# Altium footprint library Semicon-Discrete.pcblib: 205 footprints (part 8 of 13)
Each footprint in its own frame and in the unit in brackets; x right, y up, seen from the top. Pads: shape width x height; smd on the part's side, far side on the other; paste and mask are expansions set on the pad; w line width, h text height; cw(c..) or ccw(c..) is an arc to the next point about the centre after c.
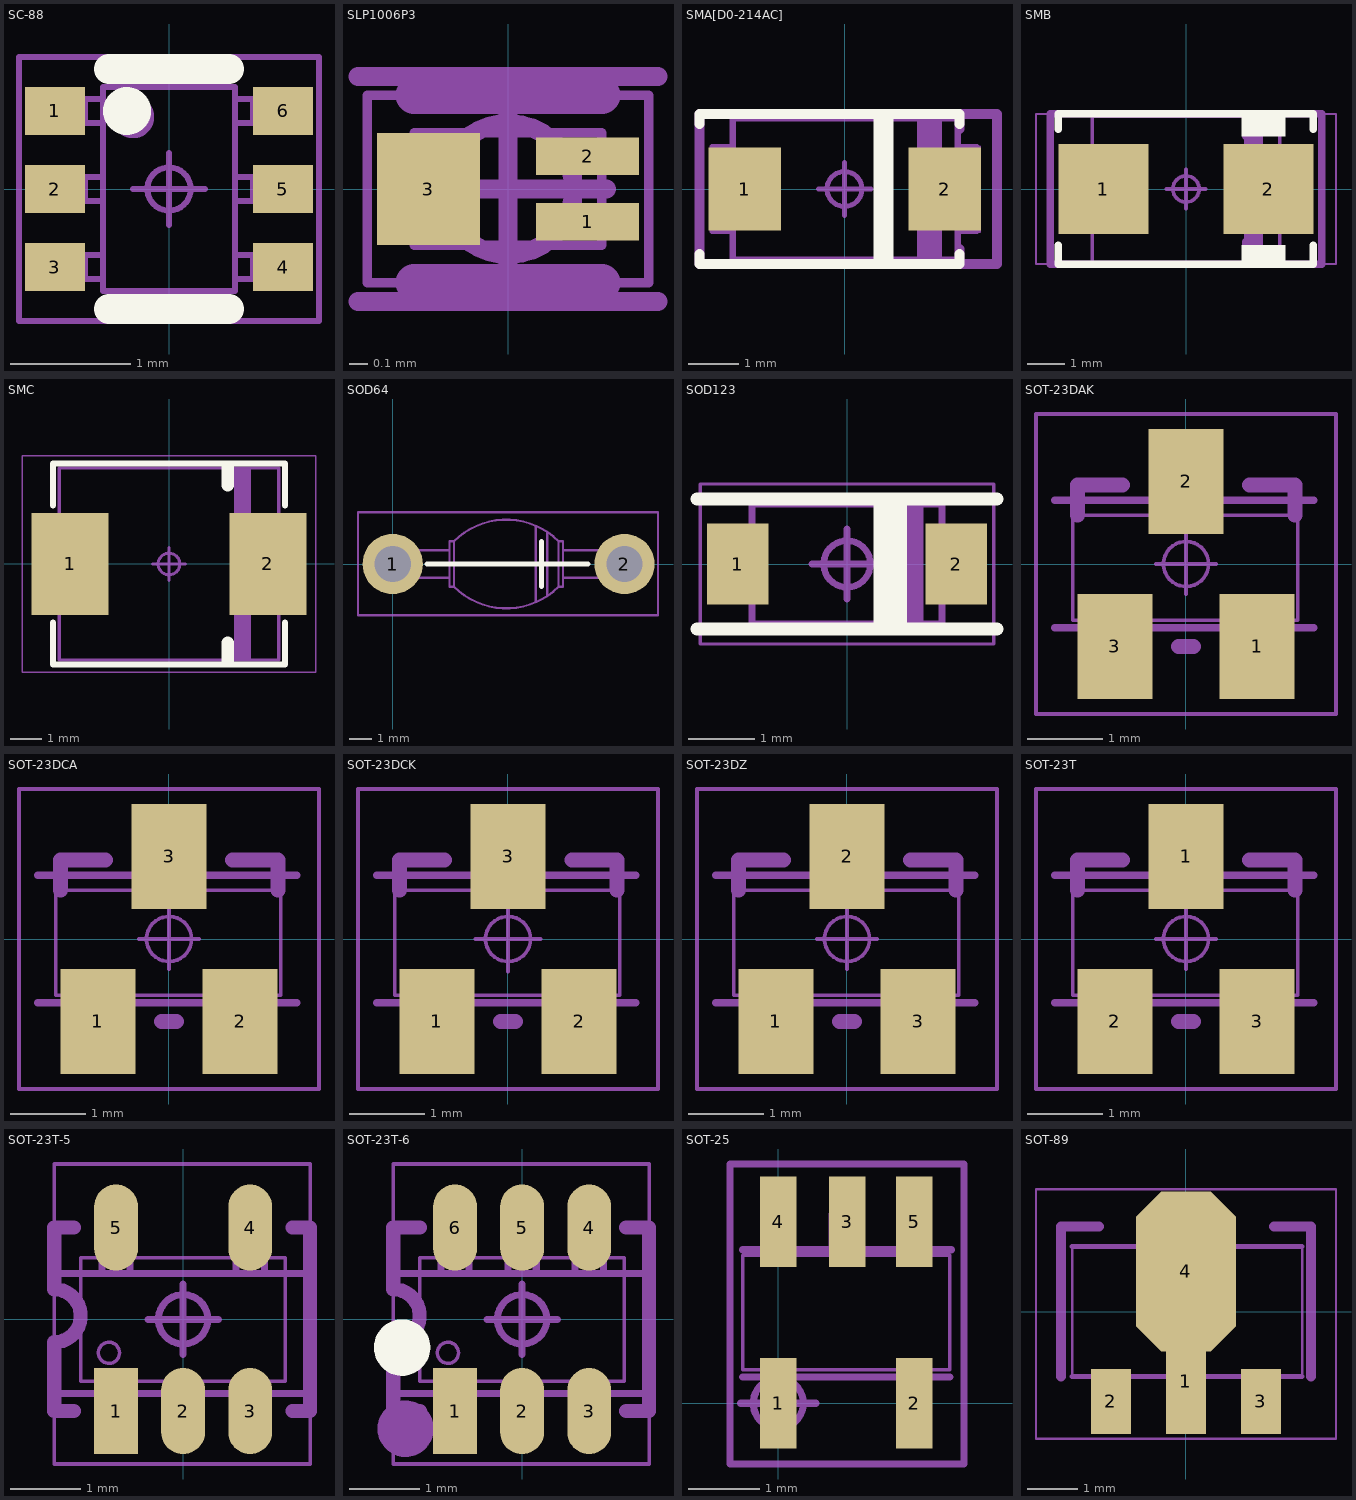
[diagram p7: the footprints below, top view; thin cyan lines are the x and y axes]

## SC-88 [mm]
height 1
pads (6):
  rect 0.5x0.4 smd: 1(-0.95,0.65) 2(-0.95,0) 3(-0.95,-0.65) 4(0.95,-0.65) 5(0.95,0) 6(0.95,0.65)
TopOverlay:
  circle w0.2: c-0.35,0.65 r0.1
  lines w0.254: -0.5,-1 0.5,-1 ; -0.5,1 0.5,1
2-TopCompOutl:
  circle w0.254: c-0.3,0.6 r0.05
  lines w0.05: -0.8,-0.75 -0.8,-0.55 ; -0.8,-0.1 -0.8,0.1 ; -0.8,0.55 -0.8,0.75 ; -0.7,-0.75 -0.7,-0.55 ; -0.7,-0.1 -0.7,0.1 ; -0.7,0.55 -0.7,0.75 ; -0.55,-0.75 -1.1,-0.75 -1.1,-0.55 -0.55,-0.55 ; -0.55,-0.1 -1.1,-0.1 -1.1,0.1 -0.55,0.1 ; -0.55,0.55 -1.1,0.55 -1.1,0.75 -0.55,0.75 ; 0.55,-0.75 1.1,-0.75 1.1,-0.55 0.55,-0.55 ; 0.55,-0.1 1.1,-0.1 1.1,0.1 0.55,0.1 ; 0.55,0.55 1.1,0.55 1.1,0.75 0.55,0.75 ; 0.7,-0.75 0.7,-0.55 ; 0.7,-0.1 0.7,0.1 ; 0.7,0.55 0.7,0.75 ; 0.8,-0.75 0.8,-0.55 ; 0.8,-0.1 0.8,0.1 ; 0.8,0.55 0.8,0.75 ; -0.55,-0.85 0,-0.85 0.55,-0.85 0.55,0 0.55,0.85 0,0.85 -0.55,0.85 -0.55,0 -0.55,-0.85
4-TopCourty:
  circle w0.05: c0,0 r0.18
  lines w0.05: -0.3,0 0.3,0 ; 0,-0.3 0,0.3 ; -1.25,-1.1 1.25,-1.1 1.25,1.1 0,1.1 -1.25,1.1 -1.25,-1.1
7-TopAssy:
  circle w0.254: c-0.3,0.6 r0.05
  lines w0.05: -0.8,-0.75 -0.8,-0.55 ; -0.8,-0.1 -0.8,0.1 ; -0.8,0.55 -0.8,0.75 ; -0.7,-0.75 -0.7,-0.55 ; -0.7,-0.1 -0.7,0.1 ; -0.7,0.55 -0.7,0.75 ; -0.55,-0.75 -1.1,-0.75 -1.1,-0.55 -0.55,-0.55 ; -0.55,-0.1 -1.1,-0.1 -1.1,0.1 -0.55,0.1 ; -0.55,0.55 -1.1,0.55 -1.1,0.75 -0.55,0.75 ; 0.55,-0.75 1.1,-0.75 1.1,-0.55 0.55,-0.55 ; 0.55,-0.1 1.1,-0.1 1.1,0.1 0.55,0.1 ; 0.55,0.55 1.1,0.55 1.1,0.75 0.55,0.75 ; 0.7,-0.75 0.7,-0.55 ; 0.7,-0.1 0.7,0.1 ; 0.7,0.55 0.7,0.75 ; 0.8,-0.75 0.8,-0.55 ; 0.8,-0.1 0.8,0.1 ; 0.8,0.55 0.8,0.75 ; -0.55,-0.85 0,-0.85 0.55,-0.85 0.55,0 0.55,0.85 0,0.85 -0.55,0.85 -0.55,0 -0.55,-0.85
  text ".Designator" at 0.55,-1.275 h1.8
3D body "SC-88.STEP": height 0.99, standoff -0.01, extent -1.15,-1 1.15,1

## SLP1006P3 [mm] "3DModel=0805.ogl"
pads (3):
  rect 0.55x0.2 smd: 1(0.425,-0.175) 2(0.425,0.175)
  rect 0.55x0.6 smd: 3(-0.425,0)
2-TopCompOutl:
  lines w0.05: -0.5,-0.3 -0.5,0 -0.5,0.3 0.5,0.3 0.5,-0.3 -0.5,-0.3
4-TopCourty:
  circle w0.1: c0,0 r0.35
  lines w0.05: -0.75,-0.5 -0.75,0.5 0.75,0.5 0.75,-0.5 -0.75,-0.5
  lines w0.1: -0.525,0 0.525,0 ; 0,-0.525 0,0.525
7-TopAssy:
  lines w0.1: -0.8,-0.6 0.8,-0.6 ; -0.8,0.6 0.8,0.6
  text ".Designator" at -1.275,-0.525 h1.6
13-SMDTopOverlay:
  lines w0.2: -0.5,-0.5 0.5,-0.5 ; -0.5,0.5 0.5,0.5
3D body "SLP1006P3.STEP": height 0.5, standoff 0, extent -0.575,-0.3 0.525,0.3

## SMA[D0-214AC] [mm] "Surface Mount Plastic Rectifier"
height 2.3
pads (2):
  rect 1.45x1.67 smd: 1(-2,0) 2(2,0)
TopOverlay:
  lines w0.2: -2.9,-1.3 -2.9,-1.5 2.3,-1.5 2.3,-1.3 ; -2.9,1.3 -2.9,1.5 2.3,1.5 2.3,1.3
  lines w0.4: 0.775,-1.4 0.775,1.375
2-TopCompOutl:
  lines w0.05: -2.2,-0.85 -2.6,-0.85 -2.6,0.85 -2.2,0.85 ; 1.5,-1.4 1.5,1.4 ; 1.7,-1.4 1.7,1.4 ; 2.3,-0.85 2.7,-0.85 2.7,0.85 2.3,0.85 ; -2.2,-1.4 -2.2,1.4 2.3,1.4 2.3,-1.4 -2.2,-1.4
4-TopCourty:
  circle w0.1: c0,0 r0.35
  lines w0.05: -2.95,-1.5 3,-1.5 3,1.5 -2.95,1.5 -2.95,-1.5
  lines w0.1: -0.525,0 0.525,0 ; 0,-0.525 0,0.525
7-TopAssy:
  rectangle: 1.45,-1.4 1.95,1.4
  lines w0.1: -2.25,-0.85 -2.65,-0.85 -2.65,0.85 -2.25,0.85 ; 2.25,-0.85 2.65,-0.85 2.65,0.85 2.25,0.85 ; -2.25,-1.4 -2.25,1.4 2.25,1.4 2.25,-1.4 -2.25,-1.4
  text ".Designator" at -1.925,-0.65 h2.2
13-SMDTopOverlay:
  lines w0.2: 2.3,-1.5 2.3,-1.2 ; 2.3,1.2 2.3,1.5 ; -2.9,-1.5 1.25,-1.5 3.05,-1.5 3.05,1.5 -2.9,1.5 -2.9,-1.5
3D body "SMA[D0-214AC].STEP": height 2.36, standoff 0, extent -2.6,-1.45 2.6,1.45

## SMB [mm]
pads (2):
  rect 2.4x2.4 smd: 1(-2.2,0) 2(2.2,0)
TopOverlay:
  rectangle: 1.475,1.4 2.65,1.975
  rectangle: 1.475,-1.975 2.65,-1.5
  lines w0.2: -3.4,-1.5 -3.4,-2 3.4,-2 3.4,-1.5 ; -3.4,1.6 -3.4,2 3.4,2 3.4,1.6
2-TopCompOutl:
  lines w0.05: -2.5,-1.1 -2.85,-1.1 -2.85,1.1 -2.5,1.1 ; 2.5,-1.1 2.85,-1.1 2.85,1.1 2.5,1.1 ; -2.5,-1.95 2.5,-1.95 2.5,1.95 -2.5,1.95 -2.5,-1.95
4-TopCourty:
  circle w0.1: c0,0 r0.35
  lines w0.05: -4,-2 -4,2 4,2 4,-2 -4,-2
  lines w0.1: -0.525,0 0.525,0 ; 0,-0.525 0,0.525
7-TopAssy:
  rectangle: 1.55,-1.95 2.05,1.95
  lines w0.1: -2.5,-1.1 -2.85,-1.1 -2.85,1.1 -2.5,1.1 ; 2.5,-1.1 2.85,-1.1 2.85,1.1 2.5,1.1 ; -2.5,-1.95 2.5,-1.95 2.5,1.95 -2.5,1.95 -2.5,-1.95
  text ".Designator" at -2.55,-0.625 h2.2
13-SMDTopOverlay:
  lines w0.2: 1.6,-2 1.6,-1.4 ; 1.6,1.4 1.6,2 ; -3.625,-2 -3.625,2 1.05,2 3.625,2 3.625,-2 1.05,-2 -3.625,-2
3D body "SMB.STEP": height 2.36, standoff 0, extent -2.825,-1.975 2.875,1.975

## SMC [mm]
pads (2):
  rect 2.5x3.3 smd: 1(-3.2,0) 2(3.2,0)
TopOverlay:
  lines w0.2: -3.75,-1.9 -3.75,-3.25 3.75,-3.25 3.75,-1.9 ; -3.75,1.9 -3.75,3.25 3.75,3.25 3.75,1.9
  lines w0.4: 1.9,-3.15 1.9,-2.55 ; 1.9,2.55 1.9,3.15
2-TopCompOutl:
  rectangle: 2.1,-3.1 2.65,3.1
  lines w0.05: -3.55,-1.55 -4.05,-1.55 -4.05,1.55 -3.55,1.55 ; 3.55,-1.55 4.05,-1.55 4.05,1.55 3.55,1.55 ; -3.55,-3.1 3.55,-3.1 3.55,3.1 -3.55,3.1 -3.55,-3.1
4-TopCourty:
  circle w0.1: c0,0 r0.35
  lines w0.05: -4.75,-3.5 4.75,-3.5 4.75,3.5 -4.75,3.5 -4.75,-3.5
  lines w0.1: -0.525,0 0.525,0 ; 0,-0.525 0,0.525
7-TopAssy:
  rectangle: 2.1,-3.1 2.65,3.1
  lines w0.1: -3.55,-1.55 -4.05,-1.55 -4.05,1.55 -3.55,1.55 ; 3.55,-1.55 4.05,-1.55 4.05,1.55 3.55,1.55 ; -3.55,-3.1 3.55,-3.1 3.55,3.1 -3.55,3.1 -3.55,-3.1
  text ".Designator" at -1.3,-0.625 h2
3D body "SMC.STEP": height 2.6, standoff 0, extent -4.025,-3.1 4.075,3.1

## SOD64 [mm]
pads (2):
  round 2.65 hole 1.6: 1(0,0) 2(10.2,0)
TopOverlay:
  lines w0.2: 1.5,0 4,0 8.6,0 ; 6.55,-1 6.55,1
2-TopCompOutl:
  lines w0.1: 2.5,-0.6 0,-0.6 0,0.6 2.5,0.6 ; 6.299,-1.676 6.299,1.676 ; 6.8,-1.4 6.8,1.4 ; 7.5,-0.6 10,-0.6 10,0.6 7.5,0.6 ; 2.7,-1 ccw(c5,1.3) 7.3,-1 ; 2.7,-1 2.7,0 2.7,1 ; 2.7,-1 2.5,-1 2.5,0 2.5,1 2.7,1 ; 2.7,1 cw(c5,-1.3) 7.3,1 ; 7.3,-1 7.3,0 7.3,1 ; 7.3,-1 7.5,-1 7.5,0 7.5,1 7.3,1
4-TopCourty:
  circle w0.1: c0,0 r0.35
  lines w0.1: -0.525,0 0.525,0 ; 0,-0.525 0,0.525 ; -1.525,-2.25 -1.525,2.275 11.675,2.275 11.675,-2.25 -1.525,-2.25
7-TopAssy:
  lines w0.1: 2.5,-0.6 0,-0.6 cw(c0,0) 0,0.6 2.5,0.6 ; 6.299,-1.676 6.299,1.676 ; 6.8,-1.4 6.8,1.4 ; 7.5,-0.6 10,-0.6 ccw(c10,0) 10,0.6 7.5,0.6 ; 2.7,-1 ccw(c5,1.3) 7.3,-1 ; 2.7,-1 2.5,-1 2.5,0 2.5,1 2.7,1 ; 2.7,-1 2.7,0 2.7,1 ; 2.7,1 cw(c5,-1.3) 7.3,1 ; 7.3,-1 7.5,-1 7.5,0 7.5,1 7.3,1 ; 7.3,-1 7.3,0 7.3,1
  text ".Designator" at 3.15,-0.775 h2.2

## SOD123 [mm] "Surface Mount Plastic Rectifier"
height 1.2
pads (2):
  rect 0.92x1.22 smd: 1(-1.64,0) 2(1.64,0)
TopOverlay:
  rectangle: 0.4,-0.95 0.9,1
  lines w0.2: -2.25,-0.975 2.25,-0.975 ; -2.25,0.975 2.25,0.975
2-TopCompOutl:
  lines w0.05: -1.45,-0.35 -1.85,-0.35 -1.85,0.35 -1.45,0.35 ; 0.9,-0.9 0.9,0.9 ; 1.1,-0.9 1.1,0.9 ; 1.45,-0.35 1.85,-0.35 1.85,0.35 1.45,0.35 ; -1.425,-0.9 -1.425,0.9 1.425,0.9 1.425,-0.9 -1.425,-0.9
4-TopCourty:
  circle w0.1: c0,0 r0.35
  lines w0.05: -2.2,-1.2 -2.2,1.2 2.2,1.2 2.2,-1.2 -2.2,-1.2
  lines w0.1: -0.525,0 0.525,0 ; 0,-0.525 0,0.525
7-TopAssy:
  rectangle: 0.825,-0.9 1.15,0.9
  lines w0.1: -1.45,-0.35 -1.85,-0.35 -1.85,0.35 -1.45,0.35 ; 1.45,-0.35 1.85,-0.35 1.85,0.35 1.45,0.35 ; -1.425,-0.9 -1.425,0.9 1.425,0.9 1.425,-0.9 -1.425,-0.9
  text ".Designator" at -1.65,-0.6 h1.8
3D body "SOD123.STEP": height 1.27, standoff 0, extent -1.875,-0.825 1.825,0.775

## SOT-23DAK [mm] "SOT-23.ogl"
pads (3):
  rect 1x1.4 smd: 1(0.95,-1.1) 2(0,1.1) 3(-0.95,-1.1)
2-TopCompOutl:
  lines w0.05: -1.15,-0.75 -1.15,-1.35 -0.75,-1.35 -0.75,-0.75 ; -0.2,0.65 -0.2,1.25 0.2,1.25 0.2,0.65 ; 0.75,-0.75 0.75,-1.35 1.15,-1.35 1.15,-0.75 ; -1.509,-0.75 -1.509,0.65 1.491,0.65 1.491,-0.75 -1.509,-0.75
4-TopCourty:
  circle w0.05: c0,0 r0.3
  lines w0.05: -0.4,0 0.4,0 ; 0,-0.4 0,0.4 ; -2,-2 -2,2 2,2 2,-2 -2,-2
7-TopAssy:
  lines w0.1: -1.75,-0.85 1.7,-0.85 ; -1.75,0.85 1.7,0.85 ; -1.15,-0.85 -1.15,-1.45 -0.75,-1.45 -0.75,-0.85 ; -0.2,0.85 -0.2,1.45 0.2,1.45 0.2,0.85 ; 0.75,-0.85 0.75,-1.45 1.15,-1.45 1.15,-0.85
  text ".Designator" at -1.85,-0.55 h1.8
13-SMDTopOverlay:
  lines w0.2: -1.45,0.65 -1.45,1.05 -0.85,1.05 ; -0.1,-1.1 0.1,-1.1 ; 0.85,1.05 1.45,1.05 1.45,0.65
3D body "SOT-23DAK.STEP": height 1.4, standoff 0, extent -1.4,-1.5 1.409,1.59

## SOT-23DCA [mm] "SOT-23.ogl"
pads (3):
  rect 1x1.4 smd: 1(-0.95,-1.1) 2(0.95,-1.1) 3(0,1.1)
2-TopCompOutl:
  lines w0.05: -1.15,-0.75 -1.15,-1.35 -0.75,-1.35 -0.75,-0.75 ; -0.2,0.65 -0.2,1.25 0.2,1.25 0.2,0.65 ; 0.75,-0.75 0.75,-1.35 1.15,-1.35 1.15,-0.75 ; -1.509,-0.75 -1.509,0.65 1.491,0.65 1.491,-0.75 -1.509,-0.75
4-TopCourty:
  circle w0.05: c0,0 r0.3
  lines w0.05: -0.4,0 0.4,0 ; 0,-0.4 0,0.4 ; -2,-2 -2,2 2,2 2,-2 -2,-2
7-TopAssy:
  lines w0.1: -1.75,-0.85 1.7,-0.85 ; -1.75,0.85 1.7,0.85 ; -1.15,-0.85 -1.15,-1.45 -0.75,-1.45 -0.75,-0.85 ; -0.2,0.85 -0.2,1.45 0.2,1.45 0.2,0.85 ; 0.75,-0.85 0.75,-1.45 1.15,-1.45 1.15,-0.85
  text ".Designator" at -1.8,-0.55 h1.8
13-SMDTopOverlay:
  lines w0.2: -1.45,0.65 -1.45,1.05 -0.85,1.05 ; -0.1,-1.1 0.1,-1.1 ; 0.85,1.05 1.45,1.05 1.45,0.65
3D body "SOT-23DCA.STEP": height 1.4, standoff 0, extent -1.425,-1.55 1.384,1.54

## SOT-23DCK [mm] "SOT-23.ogl"
pads (3):
  rect 1x1.4 smd: 1(-0.95,-1.1) 2(0.95,-1.1) 3(0,1.1)
2-TopCompOutl:
  lines w0.05: -1.15,-0.75 -1.15,-1.35 -0.75,-1.35 -0.75,-0.75 ; -0.2,0.65 -0.2,1.25 0.2,1.25 0.2,0.65 ; 0.75,-0.75 0.75,-1.35 1.15,-1.35 1.15,-0.75 ; -1.509,-0.75 1.491,-0.75 1.491,0.65 -1.509,0.65 -1.509,-0.75
4-TopCourty:
  circle w0.05: c0,0 r0.3
  lines w0.05: -0.432,0 0.432,0 ; 0,-0.432 0,0.432 ; -2,-2 2,-2 2,2 -2,2 -2,-2
7-TopAssy:
  lines w0.1: -1.75,-0.85 1.7,-0.85 ; -1.75,0.85 1.7,0.85 ; -1.15,-0.85 -1.15,-1.45 -0.75,-1.45 -0.75,-0.85 ; -0.2,0.85 -0.2,1.45 0.2,1.45 0.2,0.85 ; 0.75,-0.85 0.75,-1.45 1.15,-1.45 1.15,-0.85
  text ".Designator" at -1.75,-0.55 h1.8
13-SMDTopOverlay:
  lines w0.2: -1.45,0.65 -1.45,1.05 -0.85,1.05 ; -0.1,-1.1 0.1,-1.1 ; 0.85,1.05 1.45,1.05 1.45,0.65
3D body "SOT-23DCK.STEP": height 1.4, standoff 0, extent -1.4,-1.525 1.409,1.565

## SOT-23DZ [mm] "SOT-23.ogl"
pads (3):
  rect 1x1.4 smd: 1(-0.95,-1.1) 2(0,1.1) 3(0.95,-1.1)
2-TopCompOutl:
  lines w0.05: -1.15,-0.75 -1.15,-1.35 -0.75,-1.35 -0.75,-0.75 ; -0.2,0.65 -0.2,1.25 0.2,1.25 0.2,0.65 ; 0.75,-0.75 0.75,-1.35 1.15,-1.35 1.15,-0.75 ; -1.509,-0.75 -1.509,0.65 1.491,0.65 1.491,-0.75 -1.509,-0.75
4-TopCourty:
  circle w0.05: c0,0 r0.3
  lines w0.05: -0.4,0 0.4,0 ; 0,-0.4 0,0.4 ; -2,-2 -2,2 2,2 2,-2 -2,-2
7-TopAssy:
  lines w0.1: -1.75,-0.85 1.7,-0.85 ; -1.75,0.85 1.7,0.85 ; -1.15,-0.85 -1.15,-1.45 -0.75,-1.45 -0.75,-0.85 ; -0.2,0.85 -0.2,1.45 0.2,1.45 0.2,0.85 ; 0.75,-0.85 0.75,-1.45 1.15,-1.45 1.15,-0.85
  text ".Designator" at -1.75,-0.55 h1.8
13-SMDTopOverlay:
  lines w0.2: -1.45,0.65 -1.45,1.05 -0.85,1.05 ; -0.1,-1.1 0.1,-1.1 ; 0.85,1.05 1.45,1.05 1.45,0.65
3D body "SOT-23DZ.STEP": height 1.4, standoff 0, extent -1.4,-1.575 1.409,1.515

## SOT-23T [mm] "SOT-23.ogl"
pads (3):
  rect 1x1.4 smd: 1(0,1.1) 2(-0.95,-1.1) 3(0.95,-1.1)
2-TopCompOutl:
  lines w0.05: -1.15,-0.75 -1.15,-1.35 -0.75,-1.35 -0.75,-0.75 ; -0.2,0.65 -0.2,1.25 0.2,1.25 0.2,0.65 ; 0.75,-0.75 0.75,-1.35 1.15,-1.35 1.15,-0.75 ; -1.509,-0.75 -1.509,0.65 1.491,0.65 1.491,-0.75 -1.509,-0.75
4-TopCourty:
  circle w0.05: c0,0 r0.3
  lines w0.05: -0.4,0 0.4,0 ; 0,-0.4 0,0.4 ; -2,-2 -2,2 2,2 2,-2 -2,-2
7-TopAssy:
  lines w0.1: -1.75,-0.85 1.7,-0.85 ; -1.75,0.85 1.7,0.85 ; -1.15,-0.85 -1.15,-1.45 -0.75,-1.45 -0.75,-0.85 ; -0.2,0.85 -0.2,1.45 0.2,1.45 0.2,0.85 ; 0.75,-0.85 0.75,-1.45 1.15,-1.45 1.15,-0.85
  text ".Designator" at -1.75,-0.55 h1.8
13-SMDTopOverlay:
  lines w0.2: -1.45,0.65 -1.45,1.05 -0.85,1.05 ; -0.1,-1.1 0.1,-1.1 ; 0.85,1.05 1.45,1.05 1.45,0.65
3D body "SOT-23T.STEP": height 1.4, standoff 0, extent -1.425,-1.525 1.384,1.565

## SOT-23T-5 [mm] "SOT-23-5pins.ogl"
pads (5):
  rect 0.62x1.22 smd: 1(-0.95,-1.3)
  oval 0.62x1.22 smd: 2(0,-1.3) 3(0.95,-1.3) 4(0.95,1.3) 5(-0.95,1.3)
2-TopCompOutl:
  circle w0.05: c-1.05,-0.475 r0.15
  lines w0.05: -1.125,-0.875 -1.125,-1.4 -0.775,-1.4 -0.775,-0.875 ; -1.125,0.875 -1.125,1.4 -0.775,1.4 -0.775,0.875 ; -0.175,-0.875 -0.175,-1.4 0.175,-1.4 0.175,-0.875 ; 0.775,-0.875 0.775,-1.4 1.125,-1.4 1.125,-0.875 ; 0.775,0.875 0.775,1.4 1.125,1.4 1.125,0.875 ; -1.45,-0.875 1.45,-0.875 1.45,0.875 -1.45,0.875 -1.45,-0.875
4-TopCourty:
  circle w0.1: c0,0 r0.35
  lines w0.05: -1.825,-2.05 1.8,-2.05 1.8,2.2 -1.825,2.2 -1.825,-2.05
  lines w0.1: -0.5,0 0.5,0 ; 0,-0.5 0,0.5
7-TopAssy:
  lines w0.1: -1.75,-1.05 1.7,-1.05 ; -1.75,0.65 1.7,0.65 ; -1.15,-1.05 -1.15,-1.65 -0.75,-1.65 -0.75,-1.05 ; -1.15,0.7 -1.15,1.3 -0.75,1.3 -0.75,0.7 ; -0.2,-1.05 -0.2,-1.65 0.2,-1.65 0.2,-1.05 ; 0.75,-1.05 0.75,-1.65 1.15,-1.65 1.15,-1.05 ; 0.75,0.65 0.75,1.25 1.15,1.25 1.15,0.65
  text ".Designator" at -1.75,-0.775 h1.8
13-SMDTopOverlay:
  lines w0.2: -1.55,-1.3 -1.825,-1.3 -1.825,-0.325 ccw(c-1.825,0.05) -1.825,0.425 -1.825,1.3 -1.55,1.3 ; 1.55,-1.3 1.8,-1.3 1.8,1.3 1.55,1.3
3D body "SOT-23T-5.STEP": height 1.4, standoff 0, extent -1.45,-1.8 1.45,1.82

## SOT-23T-6 [mm] "SOT-23.ogl"
pads (6):
  rect 0.62x1.22 smd: 1(-0.95,-1.3)
  oval 0.62x1.22 smd: 2(0,-1.3) 3(0.95,-1.3) 4(0.95,1.3) 5(0,1.3) 6(-0.95,1.3)
TopOverlay:
  circle w0.4: c-1.7,-0.4 r0.2
2-TopCompOutl:
  circle w0.05: c-1.05,-0.475 r0.15
  lines w0.05: -1.125,-0.875 -1.125,-1.4 -0.775,-1.4 -0.775,-0.875 ; -1.125,0.875 -1.125,1.4 -0.775,1.4 -0.775,0.875 ; -0.175,-0.875 -0.175,-1.4 0.175,-1.4 0.175,-0.875 ; -0.175,0.875 -0.175,1.4 0.175,1.4 0.175,0.875 ; 0.775,-0.875 0.775,-1.4 1.125,-1.4 1.125,-0.875 ; 0.775,0.875 0.775,1.4 1.125,1.4 1.125,0.875 ; -1.45,-0.875 -1.45,0.875 1.45,0.875 1.45,-0.875 -1.45,-0.875
4-TopCourty:
  circle w0.1: c0,0 r0.35
  lines w0.05: -1.825,-2.05 -1.825,2.2 1.8,2.2 1.8,-2.05 -1.825,-2.05
  lines w0.1: -0.5,0 0.5,0 ; 0,-0.5 0,0.5
7-TopAssy:
  circle w0.4: c-1.65,-1.55 r0.2
  lines w0.1: -1.75,-1.05 1.7,-1.05 ; -1.75,0.65 1.7,0.65 ; -1.15,-1.05 -1.15,-1.65 -0.75,-1.65 -0.75,-1.05 ; -1.15,0.7 -1.15,1.3 -0.75,1.3 -0.75,0.7 ; -0.2,-1.05 -0.2,-1.65 0.2,-1.65 0.2,-1.05 ; -0.2,0.65 -0.2,1.25 0.2,1.25 0.2,0.65 ; 0.75,-1.05 0.75,-1.65 1.15,-1.65 1.15,-1.05 ; 0.75,0.65 0.75,1.25 1.15,1.25 1.15,0.65
  text ".Designator" at -1.75,-0.775 h1.8
13-SMDTopOverlay:
  lines w0.2: -1.45,-1.3 -1.825,-1.3 -1.825,-0.325 ccw(c-1.825,0.05) -1.825,0.425 -1.825,1.3 -1.45,1.3 ; 1.475,-1.3 1.8,-1.3 1.8,1.3 1.475,1.3
3D body "SOT-23T-6.STEP": height 1.1, standoff 0, extent -1.425,-1.45 1.475,1.45

## SOT-25 [mil]
pads (5):
  rect 20x50 smd: 1(0,0) 2(75,0) 3(38,100) 4(0,100) 5(75,100)
2-TopCompOutl:
  lines w1.97: -6.89,20.67 -6.89,0 6.89,0 6.89,20.67 ; -6.89,89.57 -6.89,110.24 6.89,110.24 6.89,89.57 ; 30.51,89.57 30.51,110.24 44.29,110.24 44.29,89.57 ; 67.91,20.67 67.91,0 81.69,0 81.69,20.67 ; 67.91,89.57 67.91,110.24 81.69,110.24 81.69,89.57 ; -19.59,18.5 -19.59,81.5 94.59,81.5 94.59,18.5 -19.59,18.5
4-TopCourty:
  circle w3.94: c0,0 r13.78
  lines w3.94: -20.67,0 20.67,0 ; 0,-19.68 0,19.68 ; -26.57,-33.46 102.36,-33.46 102.36,131.89 -26.57,131.89 -26.57,-33.46
7-TopAssy:
  lines w3.94: -19.59,14.57 94.59,14.57 ; -19.59,84.65 95.57,84.65 ; -7.87,13.78 -7.87,-9.84 7.87,-9.84 7.87,13.78 ; -7.87,84.45 -7.87,106.3 7.87,106.3 7.87,84.45 ; 29.53,84.45 29.53,104.33 45.28,104.33 45.28,84.45 ; 66.93,13.78 66.93,-9.84 82.68,-9.84 82.68,13.78 ; 66.93,84.45 66.93,104.33 82.68,104.33 82.68,84.45
  text ".Designator" at -17.62,27.36 h70.87

## SOT-89 [mm]
pads (4):
  rect 0.8x2.1 smd: 1(0,-1.4)
  rect 0.8x1.3 smd: 2(-1.5,-1.8) 3(1.5,-1.8)
  oct 2x3.2 smd: 4(0,0.8)
2-TopCompOutl:
  lines w0.05: -1.8,-1.303 -1.8,-2.203 -1.2,-2.203 -1.2,-1.303 ; -0.9,1.297 -0.9,1.75 -0.65,2 0,2 0.65,2 0.9,1.75 0.9,1.297 ; -0.3,-1.303 -0.3,-2.203 0.3,-2.203 0.3,-1.303 ; 1.2,-1.303 1.2,-2.203 1.8,-2.203 1.8,-1.303 ; -2.276,-1.303 2.324,-1.303 2.324,1.297 -2.276,1.297 -2.276,-1.303
4-TopCourty:
  circle w0.1: c0,0 r0.4
  lines w0.05: -3,-2.55 -3,2.45 3,2.45 3,-2.55 2.95,-2.55 -3,-2.55
  lines w0.1: -0.55,0 0.55,0 ; 0,-0.575 0,0.575
7-TopAssy:
  lines w0.1: -2.276,-1.303 2.324,-1.303 ; -2.276,1.297 2.324,1.297 ; -1.8,-1.303 -1.8,-2.203 -1.2,-2.203 -1.2,-1.303 ; -0.9,1.297 -0.9,1.75 -0.65,2 0,2 0.65,2 0.9,1.75 0.9,1.297 ; -0.3,-1.303 -0.3,-2.203 0.27,-2.203 0.27,-1.303 ; 1.2,-1.303 1.2,-2.203 1.8,-2.203 1.8,-1.303
  text ".Designator" at -1.7,-0.4 h1.8
13-SMDTopOverlay:
  lines w0.2: -2.5,-1.3 -2.5,1.7 -1.738,1.7 ; 1.763,1.7 2.5,1.7 2.5,-1.3
3D body "SOT-89.STEP": height 1.5, standoff 0, extent -2.25,-2.175 2.25,1.825